# Altium footprint library 1.03-电容.PcbLib: 224 footprints (part 10 of 14)
Each footprint in its own frame and in the unit in brackets; x right, y up, seen from the top. Pads: shape width x height; smd on the part's side, far side on the other; paste and mask are expansions set on the pad; w line width, h text height; cw(c..) or ccw(c..) is an arc to the next point about the centre after c.
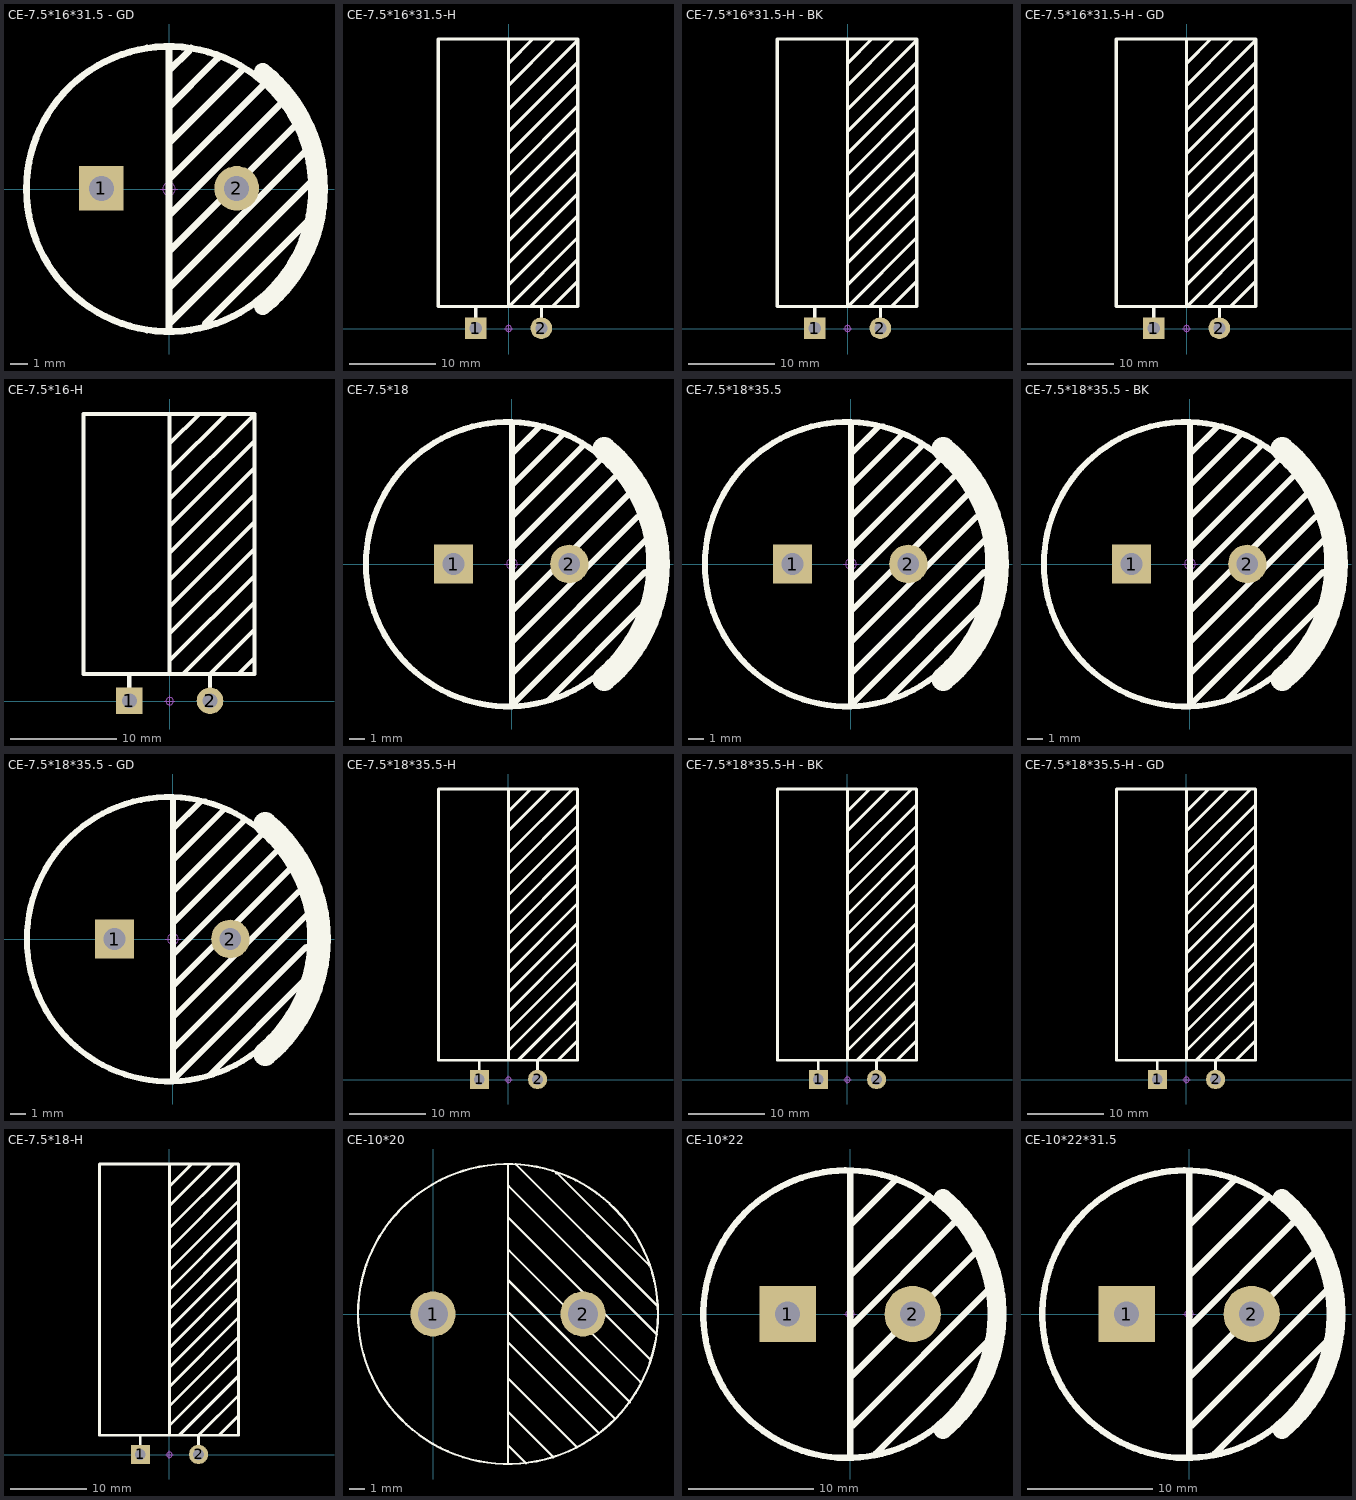
[diagram p9: the footprints below, top view; thin cyan lines are the x and y axes]

## CE-7.5*16*31.5 - GD [mm] "脚距7.5mm直径16mm高度31.5mm                 联系卖家 免费查找封装"
pads (2):
  rect 2.5x2.5 hole 1.4: 1(-3.8,0.038)
  round 2.5 hole 1.4: 2(3.8,0.038)
Top Overlay:
  circle w0.381: c0,0 r8
  lines w0.381: 0,-7.963 0,7.963 ; 0,-7.582 8.001,0.419 ; 0,-5.55 7.62,2.07 ; 0,-3.518 6.972,3.454 ; 0,-1.486 6.223,4.737 ; 0,0.546 5.296,5.842 ; 0,2.578 4.064,6.642 ; 0,4.61 2.54,7.15 2.769,7.379 ; 0,6.642 1.143,7.785 ; 2.032,-7.582 6.604,-3.01 7.81,-1.803
  lines w1: 5.259,-6.574 ccw(c0,0) 5.259,6.574
Mechanical 15:
  circle w0.05: c0,0 r0.35
  lines w0.05: -0.5,0 0.5,0 ; 0,-0.5 0,0.5
3D body "CE_TH_7_5x16x31_5.STEP": height 31.76, standoff -3.15, extent -8,-7.999 8.01,7.999

## CE-7.5*16*31.5-H [mm] "脚距7.5mm直径16mm高度31.5mm"
pads (2):
  rect 2.5x2.5 hole 1.4: 1(-3.8,0.038)
  round 2.5 hole 1.4: 2(3.8,0.038)
Top Overlay:
  lines w0.381: -3.81,1.27 -3.81,2.54 ; 0,5.08 8.001,13.081 ; 0,7.62 7.938,15.557 ; 0,10.16 7.938,18.098 ; 0,12.7 7.938,20.637 ; 0,15.24 7.938,23.177 ; 0,17.78 7.938,25.717 ; 0,20.32 7.938,28.258 ; 0,22.86 7.938,30.797 ; 0,25.4 7.929,33.329 ; 0,28.194 5.334,33.528 ; 0,30.734 2.794,33.528 ; 0,33.528 0,2.54 8.001,10.541 ; 2.54,2.54 8.001,8.001 ; 3.81,1.27 3.81,2.54 ; 5.08,2.54 8.001,5.461 ; -8.128,2.54 -8.128,33.528 8.001,33.528 8.001,2.54 -8.128,2.54
Mechanical 15:
  circle w0.05: c0,0 r0.35
  lines w0.05: -0.5,0 0.5,0 ; 0,-0.5 0,0.5
3D body "CE_TH_7.5x16x31.5-h.STEP": height 16.52, standoff -2.98, extent -8,-0.48 8.01,33.43

## CE-7.5*16*31.5-H - BK [mm] "脚距7.5mm直径16mm高度31.5mm"
pads (2):
  rect 2.5x2.5 hole 1.4: 1(-3.8,0.038)
  round 2.5 hole 1.4: 2(3.8,0.038)
Top Overlay:
  lines w0.381: -3.81,1.27 -3.81,2.54 ; 0,5.08 8.001,13.081 ; 0,7.62 7.938,15.557 ; 0,10.16 7.938,18.098 ; 0,12.7 7.938,20.637 ; 0,15.24 7.938,23.177 ; 0,17.78 7.938,25.717 ; 0,20.32 7.938,28.258 ; 0,22.86 7.938,30.797 ; 0,25.4 7.929,33.329 ; 0,28.194 5.334,33.528 ; 0,30.734 2.794,33.528 ; 0,33.528 0,2.54 8.001,10.541 ; 2.54,2.54 8.001,8.001 ; 3.81,1.27 3.81,2.54 ; 5.08,2.54 8.001,5.461 ; -8.128,2.54 -8.128,33.528 8.001,33.528 8.001,2.54 -8.128,2.54
Mechanical 15:
  circle w0.05: c0,0 r0.35
  lines w0.05: -0.5,0 0.5,0 ; 0,-0.5 0,0.5
3D body "CE_TH_7_5x16x31_5-h.STEP": height 16.38, standoff -3.12, extent -8.035,-0.48 7.975,33.43

## CE-7.5*16*31.5-H - GD [mm] "脚距7.5mm直径16mm高度31.5mm"
pads (2):
  rect 2.5x2.5 hole 1.4: 1(-3.8,0.038)
  round 2.5 hole 1.4: 2(3.8,0.038)
Top Overlay:
  lines w0.381: -3.81,1.27 -3.81,2.54 ; 0,5.08 8.001,13.081 ; 0,7.62 7.938,15.557 ; 0,10.16 7.938,18.098 ; 0,12.7 7.938,20.637 ; 0,15.24 7.938,23.177 ; 0,17.78 7.938,25.717 ; 0,20.32 7.938,28.258 ; 0,22.86 7.938,30.797 ; 0,25.4 7.929,33.329 ; 0,28.194 5.334,33.528 ; 0,30.734 2.794,33.528 ; 0,33.528 0,2.54 8.001,10.541 ; 2.54,2.54 8.001,8.001 ; 3.81,1.27 3.81,2.54 ; 5.08,2.54 8.001,5.461 ; -8.128,2.54 8.001,2.54 8.001,33.528 -8.128,33.528 -8.128,2.54
Mechanical 15:
  circle w0.05: c0,0 r0.35
  lines w0.05: -0.5,0 0.5,0 ; 0,-0.5 0,0.5
3D body "CE_TH_7.5x16x31.5-h.STEP": height 16.39, standoff -3.11, extent -8.005,-0.382 8.005,33.528

## CE-7.5*16-H [mm] "脚距7.5mm直径16mm高度25mm"
pads (2):
  rect 2.5x2.5 hole 1.4: 1(-3.8,0.038)
  round 2.5 hole 1.4: 2(3.8,0.038)
Top Overlay:
  lines w0.381: -3.81,1.27 -3.81,2.54 ; 0,2.54 0,27.051 ; 0,3.81 8.001,11.811 ; 0,6.35 8.001,14.351 ; 0,8.89 8.001,16.891 ; 0,11.43 8.001,19.431 ; 0,13.97 7.938,21.907 ; 0,16.51 7.938,24.447 ; 0,19.05 7.929,26.979 ; 0,21.717 5.334,27.051 ; 0,24.257 2.794,27.051 ; 1.27,2.54 8.001,9.271 ; 3.81,1.27 3.81,2.54 8.001,6.731 ; 6.477,2.54 8.001,4.064 ; -8.128,2.54 -8.128,27.051 8.001,27.051 8.001,2.54 -8.128,2.54
Mechanical 15:
  circle w0.05: c0,0 r0.35
  lines w0.05: -0.5,0 0.5,0 ; 0,-0.5 0,0.5
3D body "CE_TH_7_5x16x25-h.STEP": height 16.26, standoff -3.24, extent -8.005,-0.56 8.005,26.85

## CE-7.5*18 [mm] "直插电解电容-脚距7.5mm直径18mm高度35.5mm"
pads (2):
  rect 2.5x2.5 hole 1.4: 1(-3.78,0)
  round 2.5 hole 1.4: 2(3.72,0)
Top Overlay:
  circle w0.381: c-0.248,-0.013 r9.2
  lines w0.381: 0,-7.112 8.636,1.524 ; 0,-5.08 8.128,3.048 ; 0,-3.048 7.62,4.572 ; 0,-1.016 6.731,5.715 ; 0,1.016 5.715,6.731 ; 0,3.048 4.572,7.62 ; 0,5.08 3.302,8.382 ; 0,7.112 1.778,8.89 ; 0,9.144 0,-9.144 8.636,-0.508 ; 2.413,-8.763 8.636,-2.54
  lines w1.524: 5.959,-7.456 ccw(c-0.254,0) 5.959,7.456
Mechanical 15:
  circle w0.05: c0,0 r0.35
  lines w0.05: -0.5,0 0.5,0 ; 0,-0.5 0,0.5
3D body "CE_TH_7_5x18x35_5.STEP": height 35.76, standoff -3.15, extent -9,-8.997 9.01,8.997

## CE-7.5*18*35.5 [mm] "直插电解电容-脚距7.5mm直径18mm高度35.5mm"
pads (2):
  rect 2.5x2.5 hole 1.4: 1(-3.78,0)
  round 2.5 hole 1.4: 2(3.72,0)
Top Overlay:
  circle w0.381: c-0.248,-0.013 r9.2
  lines w0.381: 0,-7.112 8.636,1.524 ; 0,-5.08 8.128,3.048 ; 0,-3.048 7.62,4.572 ; 0,-1.016 6.731,5.715 ; 0,1.016 5.715,6.731 ; 0,3.048 4.572,7.62 ; 0,5.08 3.302,8.382 ; 0,7.112 1.778,8.89 ; 0,9.144 0,-9.144 8.636,-0.508 ; 2.413,-8.763 8.636,-2.54
  lines w1.524: 5.959,-7.456 ccw(c-0.254,0) 5.959,7.456
Mechanical 15:
  circle w0.05: c0,0 r0.35
  lines w0.05: -0.5,0 0.5,0 ; 0,-0.5 0,0.5
3D body "CE_TH_7.5x18x35.5-2.STEP": height 2.89, standoff -36.02, extent -9,-8.997 9.01,8.997

## CE-7.5*18*35.5 - BK [mm] "直插电解电容-脚距7.5mm直径18mm高度35.5mm"
pads (2):
  rect 2.5x2.5 hole 1.4: 1(-3.78,0)
  round 2.5 hole 1.4: 2(3.72,0)
Top Overlay:
  circle w0.381: c-0.248,-0.013 r9.2
  lines w0.381: 0,-7.112 8.636,1.524 ; 0,-5.08 8.128,3.048 ; 0,-3.048 7.62,4.572 ; 0,-1.016 6.731,5.715 ; 0,1.016 5.715,6.731 ; 0,3.048 4.572,7.62 ; 0,5.08 3.302,8.382 ; 0,7.112 1.778,8.89 ; 0,9.144 0,-9.144 8.636,-0.508 ; 2.413,-8.763 8.636,-2.54
  lines w1.524: 5.959,-7.456 ccw(c-0.254,0) 5.959,7.456
Mechanical 15:
  circle w0.05: c0,0 r0.35
  lines w0.05: -0.5,0 0.5,0 ; 0,-0.5 0,0.5
3D body "CE_TH_7_5x18x35_5.STEP": height 35.76, standoff -3.15, extent -9,-8.997 9.01,8.997

## CE-7.5*18*35.5 - GD [mm] "直插电解电容-脚距7.5mm直径18mm高度35.5mm"
pads (2):
  rect 2.5x2.5 hole 1.4: 1(-3.78,0)
  round 2.5 hole 1.4: 2(3.72,0)
Top Overlay:
  circle w0.381: c-0.248,-0.013 r9.2
  lines w0.381: 0,-7.112 8.636,1.524 ; 0,-5.08 8.128,3.048 ; 0,-3.048 7.62,4.572 ; 0,-1.016 6.731,5.715 ; 0,1.016 5.715,6.731 ; 0,3.048 4.572,7.62 ; 0,5.08 3.302,8.382 ; 0,7.112 1.778,8.89 ; 0,9.144 0,-9.144 8.636,-0.508 ; 2.413,-8.763 8.636,-2.54
  lines w1.524: 5.959,-7.456 ccw(c-0.254,0) 5.959,7.456
Mechanical 15:
  circle w0.05: c0,0 r0.35
  lines w0.05: -0.5,0 0.5,0 ; 0,-0.5 0,0.5
3D body "CE_TH_7_5x18x35_5.STEP": height 35.76, standoff -3.15, extent -9,-8.997 9.01,8.997

## CE-7.5*18*35.5-H [mm] "直插电解电容-脚距7.5mm直径18mm高度35.5mm"
pads (2):
  rect 2.5x2.5 hole 1.4: 1(-3.8,0.038)
  round 2.5 hole 1.4: 2(3.8,0.038)
Top Overlay:
  lines w0.381: -3.81,1.27 -3.81,2.54 ; 0,2.54 0,37.98 ; 0,3.81 8.955,12.765 ; 0,6.35 8.975,15.325 ; 0,8.89 8.965,17.855 ; 0,11.43 8.985,20.415 ; 0,13.97 8.975,22.945 ; 0,16.51 8.965,25.475 ; 0,19.05 8.985,28.035 ; 0,21.59 8.975,30.565 ; 0,24.13 8.965,33.095 ; 0,26.88 8.97,35.85 ; 0.02,29.62 8.36,37.96 ; 0.06,32.597 5.394,37.931 ; 0.06,35.137 2.854,37.931 ; 1.27,2.54 8.995,10.265 ; 3.81,1.27 3.81,2.54 9.005,7.735 ; 6.477,2.54 8.989,5.052 ; -9.12,2.54 -9.12,37.98 9,37.98 9,2.54 -9.12,2.54
Mechanical 15:
  circle w0.05: c0,0 r0.35
  lines w0.05: -0.5,0 0.5,0 ; 0,-0.5 0,0.5
3D body "CE_TH_7_5x18x35_5-h.STEP": height 18.26, standoff -3.24, extent -9.005,-0.43 9.005,37.98

## CE-7.5*18*35.5-H - BK [mm] "直插电解电容-脚距7.5mm直径18mm高度35.5mm"
pads (2):
  rect 2.5x2.5 hole 1.4: 1(-3.8,0.038)
  round 2.5 hole 1.4: 2(3.8,0.038)
Top Overlay:
  lines w0.381: -3.81,1.27 -3.81,2.54 ; 0,2.54 0,37.98 ; 0,3.81 8.955,12.765 ; 0,6.35 8.975,15.325 ; 0,8.89 8.965,17.855 ; 0,11.43 8.985,20.415 ; 0,13.97 8.975,22.945 ; 0,16.51 8.965,25.475 ; 0,19.05 8.985,28.035 ; 0,21.59 8.975,30.565 ; 0,24.13 8.965,33.095 ; 0,26.88 8.97,35.85 ; 0.02,29.62 8.36,37.96 ; 0.06,32.597 5.394,37.931 ; 0.06,35.137 2.854,37.931 ; 1.27,2.54 8.995,10.265 ; 3.81,1.27 3.81,2.54 9.005,7.735 ; 6.477,2.54 8.989,5.052 ; -9.12,2.54 -9.12,37.98 9,37.98 9,2.54 -9.12,2.54
Mechanical 15:
  circle w0.05: c0,0 r0.35
  lines w0.05: -0.5,0 0.5,0 ; 0,-0.5 0,0.5
3D body "CE_TH_7_5x18x35_5-h.STEP": height 18.14, standoff -3.36, extent -9.1,-0.525 8.91,37.885

## CE-7.5*18*35.5-H - GD [mm] "直插电解电容-脚距7.5mm直径18mm高度35.5mm"
pads (2):
  rect 2.5x2.5 hole 1.4: 1(-3.8,0.038)
  round 2.5 hole 1.4: 2(3.8,0.038)
Top Overlay:
  lines w0.381: -3.81,1.27 -3.81,2.54 ; 0,2.54 0,37.98 ; 0,3.81 8.955,12.765 ; 0,6.35 8.975,15.325 ; 0,8.89 8.965,17.855 ; 0,11.43 8.985,20.415 ; 0,13.97 8.975,22.945 ; 0,16.51 8.965,25.475 ; 0,19.05 8.985,28.035 ; 0,21.59 8.975,30.565 ; 0,24.13 8.965,33.095 ; 0,26.88 8.97,35.85 ; 0.02,29.62 8.36,37.96 ; 0.06,32.597 5.394,37.931 ; 0.06,35.137 2.854,37.931 ; 1.27,2.54 8.995,10.265 ; 3.81,1.27 3.81,2.54 9.005,7.735 ; 6.477,2.54 8.989,5.052 ; -9.12,2.54 9,2.54 9,37.98 -9.12,37.98 -9.12,2.54
Mechanical 15:
  circle w0.05: c0,0 r0.35
  lines w0.05: -0.5,0 0.5,0 ; 0,-0.5 0,0.5
3D body "CE_TH_7_5x18x35_5-h.STEP": height 18.26, standoff -3.24, extent -9.075,-0.575 8.935,37.835

## CE-7.5*18-H [mm] "直插电解电容-脚距7.5mm直径18mm高度35.5mm"
pads (2):
  rect 2.5x2.5 hole 1.4: 1(-3.8,0.038)
  round 2.5 hole 1.4: 2(3.8,0.038)
Top Overlay:
  lines w0.381: -3.81,1.27 -3.81,2.54 ; 0,2.54 0,37.98 ; 0,3.81 8.955,12.765 ; 0,6.35 8.975,15.325 ; 0,8.89 8.965,17.855 ; 0,11.43 8.985,20.415 ; 0,13.97 8.975,22.945 ; 0,16.51 8.965,25.475 ; 0,19.05 8.985,28.035 ; 0,21.59 8.975,30.565 ; 0,24.13 8.965,33.095 ; 0,26.88 8.97,35.85 ; 0.02,29.62 8.36,37.96 ; 0.06,32.597 5.394,37.931 ; 0.06,35.137 2.854,37.931 ; 1.27,2.54 8.995,10.265 ; 3.81,1.27 3.81,2.54 9.005,7.735 ; 6.477,2.54 8.989,5.052 ; -9.12,2.54 9,2.54 9,37.98 -9.12,37.98 -9.12,2.54
Mechanical 15:
  circle w0.05: c0,0 r0.35
  lines w0.05: -0.5,0 0.5,0 ; 0,-0.5 0,0.5
3D body "CE_TH_7_5x18x35_5-h.STEP": height 18.26, standoff -3.24, extent -9.075,-0.575 8.935,37.835

## CE-10*20 [mm]
pads (2):
  round 3 hole 2: 1(0,0) 2(10,0)
Top Overlay:
  lines w0.15: 5,-9.978 5,9.949 ; 5,-8.669 5,-8.747 6.2,-9.947 ; 5,-6.436 5,-6.511 8.037,-9.548 ; 5,-4.204 5,-4.279 9.591,-8.87 ; 5,-1.773 5,-1.886 11.067,-7.953 ; 5,0.061 5.088,0.061 12.103,-6.955 ; 5,2.294 5,2.259 13.139,-5.88 ; 5,4.209 5.085,4.209 13.818,-4.524 ; 5,6.599 5,6.445 14.534,-3.089 ; 5,8.514 5.044,8.514 14.933,-1.374 ; 5.524,9.99 14.973,0.541 ; 8.194,9.39 8.275,9.39 14.414,3.251 ; 15,-0.01 cw(c5,0) 15,0
3D body "20-10.STEP": height 1.5, standoff -25.5, extent -5,-10 15,10

## CE-10*22 [mm] "脚距10mm直径22mm高度31.5mm"
pads (2):
  rect 4.5x4.5 hole 2: 1(-5,0)
  round 4.5 hole 2: 2(5,0)
Top Overlay:
  circle w0.508: c-0.248,-0.013 r11.5
  lines w0.508: 0,-11.25 0,11.25 ; 0,-5.08 10.033,4.953 ; 0,-1.016 8.382,7.366 ; 0,3.048 6.223,9.271 ; 0,7.112 3.556,10.668 ; 0.254,-8.89 11.43,2.286 ; 2.032,-11.176 11.049,-2.159
  lines w1.524: 7.428,-9.219 ccw(c-0.254,0) 7.428,9.219
Mechanical 15:
  circle w0.05: c0,0 r0.35
  lines w0.05: -0.5,0 0.5,0 ; 0,-0.5 0,0.5
3D body "CE_TH_10x22x31_5-2.STEP": height 31.64, standoff -3.27, extent -11,-11 11.01,11

## CE-10*22*31.5 [mm] "脚距10mm直径22mm高度31.5mm"
pads (2):
  rect 4.5x4.5 hole 2: 1(-5,0)
  round 4.5 hole 2: 2(5,0)
Top Overlay:
  circle w0.508: c-0.248,-0.013 r11.5
  lines w0.508: 0,-11.25 0,11.25 ; 0,-5.08 10.033,4.953 ; 0,-1.016 8.382,7.366 ; 0,3.048 6.223,9.271 ; 0,7.112 3.556,10.668 ; 0.254,-8.89 11.43,2.286 ; 2.032,-11.176 11.049,-2.159
  lines w1.524: 7.428,-9.219 ccw(c-0.254,0) 7.428,9.219
Mechanical 15:
  circle w0.05: c0,0 r0.35
  lines w0.05: -0.5,0 0.5,0 ; 0,-0.5 0,0.5
3D body "CE_TH_10x22x31.5-2.STEP": height 31.64, standoff -3.27, extent -11,-11 11.01,11